# Altium footprint library hphonglib.PcbLib: 1250 footprints (part 61 of 79)
Each footprint in its own frame and in the unit in brackets; x right, y up, seen from the top. Pads: shape width x height; smd on the part's side, far side on the other; paste and mask are expansions set on the pad; w line width, h text height; cw(c..) or ccw(c..) is an arc to the next point about the centre after c.
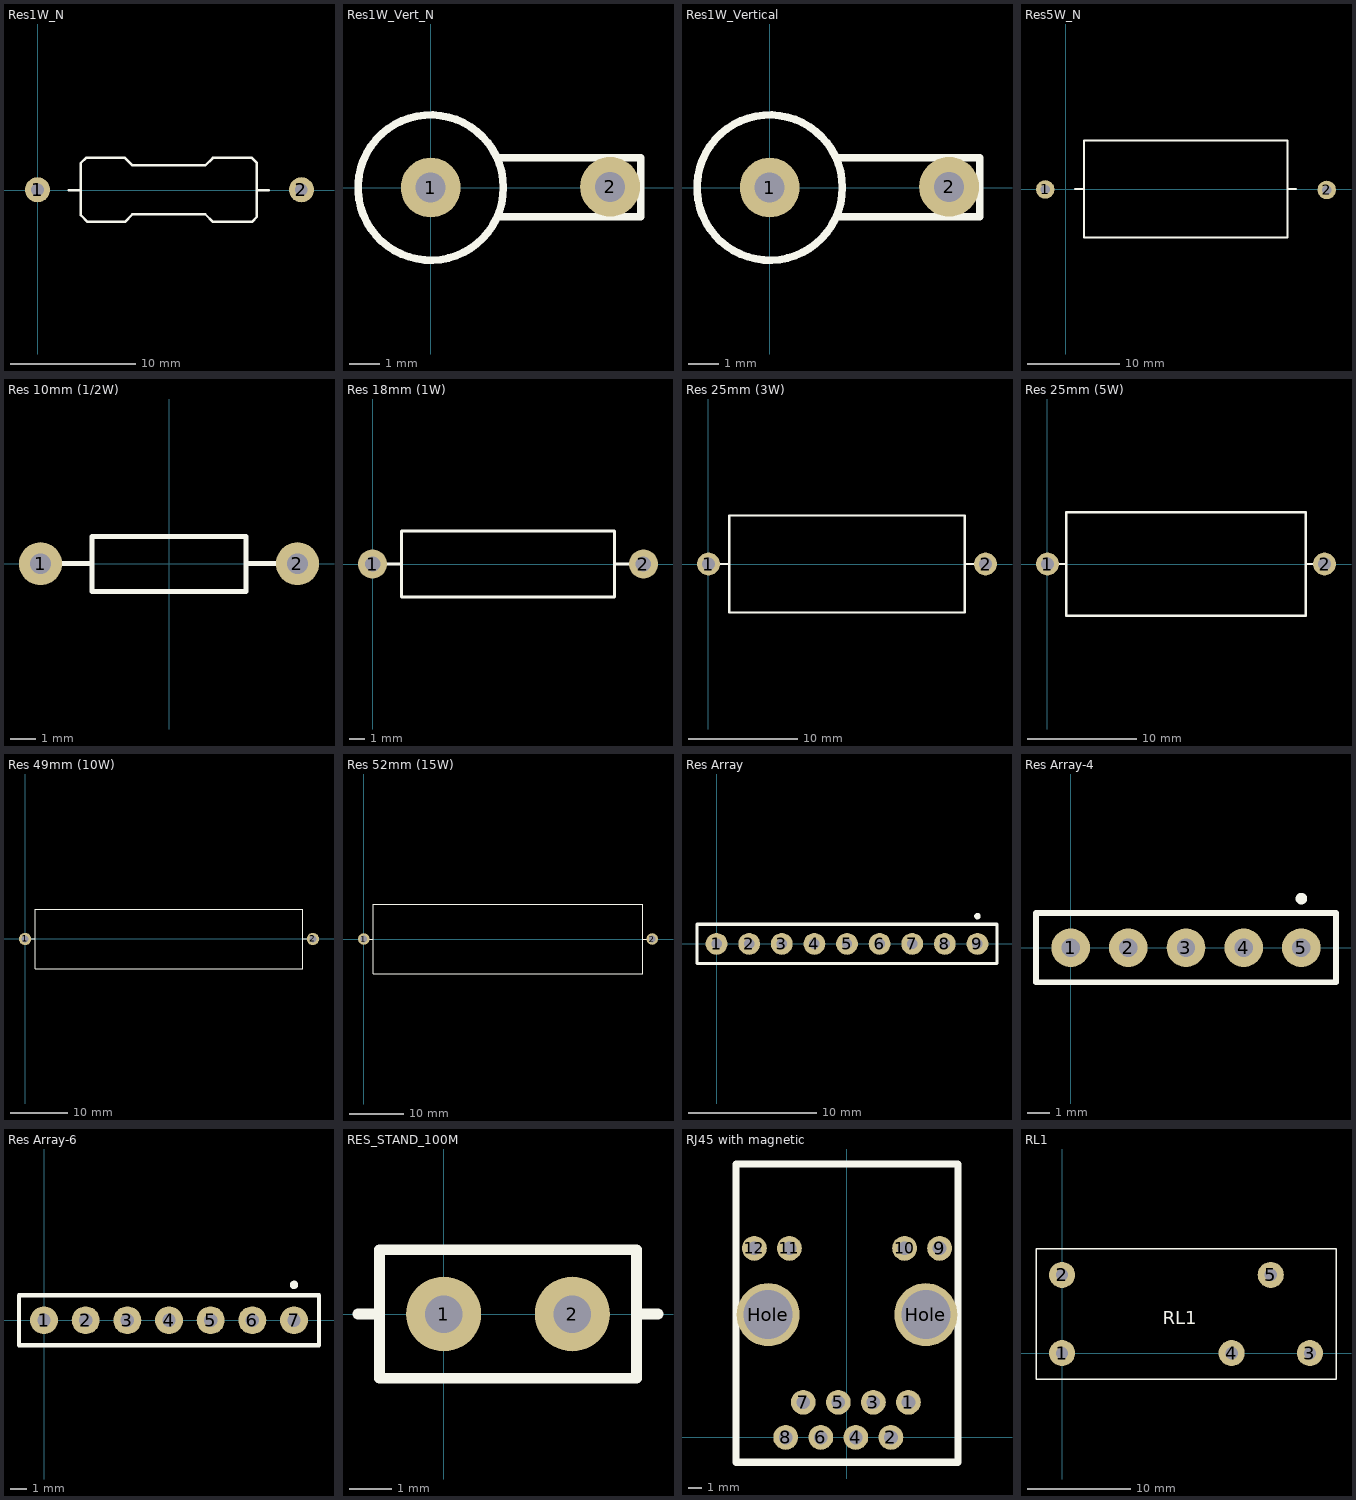
[diagram p60: the footprints below, top view; thin cyan lines are the x and y axes]

## Res1W_N [mm]
pads (2):
  round 2 hole 1: 1(-0.025,0.051) 2(21,0.051)
Top Overlay:
  lines w0.2: 2.473,0 3.423,0 3.423,-1.975 3.948,-2.5 6.929,-2.5 7.529,-1.9 13.342,-1.9 13.942,-2.5 17.048,-2.5 17.448,-2.1 17.448,2.2 17.048,2.6 13.942,2.6 13.342,2 7.529,2 6.929,2.6 3.848,2.6 3.423,2.175 3.423,-0.025 ; 17.473,0 18.398,0
Bottom Overlay:
  lines w0.254: -1.5,-2.574 22.403,-2.574 22.403,2.801 -1.5,2.801 -1.5,-2.574
3D body "AXIAL_RESISTOR(3W).STEP": height 8.3, standoff -2, extent -0.61,-3.327 21.59,3.273

## Res1W_Vert_N [mm] "Res 8mm*2mm"
pads (2):
  round 2 hole 1: 1(0,0) 2(6,0.025)
Top Overlay:
  circle w0.254: c0,0 r2.43
  lines w0.254: 2.225,-0.975 7.025,-0.975 7.025,1 2.225,1
Bottom Overlay:
  lines w0.254: -1.425,2 7.6,2 7.6,-2.525 -1.575,-2.525 -1.575,2 -1.125,2
3D body "AXIAL_RESISTOR(3W_VERT).STEP": height 25.05, standoff -1.1, extent -1.736,-3.277 6.664,3.323

## Res1W_Vertical [mm] "Res 8mm*2mm"
pads (2):
  round 2 hole 1: 1(0,0) 2(6,0.025)
Top Overlay:
  circle w0.254: c0,0 r2.43
  lines w0.254: 2.225,-0.975 7.025,-0.975 7.025,1 2.225,1
Bottom Overlay:
  lines w0.254: -1.425,2 7.6,2 7.6,-2.525 -1.575,-2.525 -1.575,2 -1.125,2
3D body: height 12.5, standoff 11.5, extent 0.1,-0.474 6.1,0.524
3D body: height 5.8, standoff 5, extent -2.465,-2.475 2.515,2.515
3D body: height 9.8, standoff 9, extent -2.515,-2.465 2.465,2.525
3D body: height 9.25, standoff 1.25, extent -2.4,-2.37 2.381,2.42
3D body: height 5, standoff 0, extent -2.487,-2.475 2.487,2.504
3D body: height 11.75, standoff 6.75, extent -2.487,-2.475 2.487,2.504
3D body: height 7.8, standoff 7, extent -2.515,-2.465 2.465,2.525
3D body: height 3.8, standoff 3, extent -2.48,-2.495 2.5,2.495
3D body: height 11, standoff -1, extent 5.525,-0.474 6.521,0.524
3D body: height 0, standoff -1, extent -0.521,-0.499 0.475,0.499

## Res5W_N [mm] "Kich thuoc 22(mm) * 10(mm)"
height 10
pads (2):
  round 2 / inner round 1.2 / far side round 2 hole 1: 1(-2.21,-0.051) 2(28.296,-0.102)
Top Overlay:
  lines w0.2: 1.025,0 1.975,0 1.975,-5.25 24.025,-5.25 24.025,5.25 2,5.25 ; 1.975,-0.025 1.975,5.225 ; 24.025,0 24.95,0
Bottom Overlay:
  lines w0.254: 26.975,5.025 27.6,5.025 27.6,-5 -1.5,-5 -1.5,5.025 27.025,5.025
3D body "Res5W.STEP": height 9.35, standoff -1.85, extent -2.483,-3.48 28.797,3.52

## Res 10mm (1/2W) [mil] "Resistor; 2 Leads; 1/2W; Solder Pad 35mil"
height 80
pads (2):
  round 67 hole 32: 1(-200,0) 2(200,0)
Top Overlay:
  lines w7.87: -200,0 -120,0 ; 120,0 200,0 ; -120,-43 -120,42 120,42 120,-43 -120,-43
3D body "SW3dPS-RESISTOR, 0.25 W, 0.4 IN LEAD PITCH.STEP": height 95.5, standoff -120, extent -212,-46 212,45

## Res 18mm (1W) [mil] "Resistor; 2 Leads; 1W; Solder Pad 35mil"
height 80
pads (2):
  round 75 hole 40: 1(0,0) 2(700,0)
Top Overlay:
  lines w7.87: 0,0 75,0 ; 625,0 700,0 ; 75,-85 75,85 625,85 625,-85 75,-85
3D body "Resistor 1W.STEP": height 181.85, standoff -178.74, extent -15.74,-84.73 715.75,85.26

## Res 25mm (3W) [mil] "Resistor; 2 Leads; 3W; Solder Pad 35mil"
height 80
pads (2):
  round 83 hole 48: 1(0,0) 2(1000,0)
Top Overlay:
  lines w7.87: 0,0 75,0 ; 925,0 1000,0 ; 75,-175 75,175 925,175 925,-175 75,-175
3D body "Resistor 3W.STEP": height 351.85, standoff -98.74, extent -19.68,-174.81 1019.69,175.18

## Res 25mm (5W) [mil] "Resistor; 2 Leads; 5W; Solder Pad 35mil"
height 80
pads (2):
  round 83 hole 48: 1(0,0) 2(1000,0)
Top Overlay:
  lines w7.87: 0,0 68,0 ; 932,0 1000,0 ; 68,-187 932,-187 932,187 68,187 68,-187
3D body "5W Resistor.STEP": height 363.6, standoff -97.43, extent -19.69,-190.89 1019.68,191

## Res 49mm (10W) [mil] "Resistor; 2 Leads; 10W; Solder Pad 35mil"
height 80
pads (2):
  round 83 hole 48: 1(0,0) 2(1960,0)
Top Overlay:
  lines w7.87: 0,0 69,0 ; 1891,0 1960,0 ; 69,-201 69,201 1891,201 1891,-201 69,-201
3D body "10W Resistor.STEP": height 363.6, standoff -97.43, extent -19.68,-204.99 1979.69,205

## Res 52mm (15W) [mil] "Resistor; 2 Leads; 15W; Solder Pad 35mil"
height 80
pads (2):
  round 83 hole 48: 1(0,0) 2(2080,0)
Top Overlay:
  lines w7.87: 0,0 70,0 ; 2011,0 2080,0 ; 70,-250 2011,-250 2011,250 70,250 70,-250
3D body "Resistor 15W.STEP": height 363.6, standoff -97.43, extent -19.68,-253.42 2099.7,253.58

## Res Array [mil] "Resistor Array; 9 Leads; Solder Pad 35mil"
pads (9):
  round 67 hole 32: 1(0,0) 2(100,0) 3(200,0) 4(300,0) 5(400,0) 6(500,0) 7(600,0) 8(700,0) 9(800,0)
Top Overlay:
  circle w10: c800,85 r5
  lines w10: -60,-60 -60,60 860,60 860,-60 -60,-60
3D body "SW3dPS-80015102.STEP": height 199.29, standoff -135.35, extent -42.5,-24.21 843.33,25

## Res Array-4 [mil] "Resistor Array; 4 Leads; Solder Pad 35mil"
pads (5):
  round 67 hole 32: 1(0,0) 2(100,0) 3(200,0) 4(300,0) 5(400,0)
Top Overlay:
  circle w10: c400,85 r5
  lines w10: -60,-60 460,-60 460,60 -60,60 -60,-60

## Res Array-6 [mil] "Resistor Array; 6 Leads; Solder Pad 35mil"
pads (7):
  round 67 hole 32: 1(0,0) 2(100,0) 3(200,0) 4(300,0) 5(400,0) 6(500,0) 7(600,0)
Top Overlay:
  circle w10: c600,85 r5
  lines w10: -60,-60 660,-60 660,60 -60,60 -60,-60

## RES_STAND_100M [mil]
pads (2):
  round 70 hole 35: 1(0,0) 2(120,0)
Top Overlay:
  lines w10: -80,0 -60,0 ; 180,0 200,0 ; -60,-60 -60,60 180,60 180,-60 -60,-60
3D body "User Library-Resistor-Up.STEP": height 348, standoff -65, extent -10,-46 166,46

## RJ45 with magnetic [mm]
pads (14):
  round 1.8 hole 1: 1(4.45,2.54) 2(3.18,0) 3(1.91,2.54) 4(0.64,0) 5(-0.63,2.54) 6(-1.9,0) 7(-3.17,2.54) 8(-4.44,0) 9(6.715,13.7) 10(4.175,13.7) 11(-4.175,13.7) 12(-6.715,13.7)
  round 4.572 hole 3.556: Hole(-5.715,8.89) Hole(5.715,8.89)
Top Overlay:
  lines w0.508: -8.05,-1.803 -8.05,19.812 8.05,19.812 8.05,0 8.05,-1.803 -8.05,-1.803
Bottom Overlay:
  lines w0.1: -7.95,-1.93 8.052,-1.93 8.052,19.761 -7.95,19.761 -7.95,-1.93
3D body "RJ45.STEP": height 14.75, standoff -3.68, extent -8.355,-1.035 8.355,15.215

## RL1 [mm] "Relè body 29x12mm - 1 way - FEME"
pads (5):
  round 2.54 hole 1.2 unplated: 1(0,0) 2(0,7.62) 3(24.13,0) 4(16.51,0) 5(20.32,7.62)
Top Overlay:
  lines w0.127: -2.54,-2.54 26.67,-2.54 26.67,10.16 -2.54,10.16 -2.54,-2.54
  text "RL1" at 9.779,2.794 h1.27